# Altium footprint library Caps.PcbLib: 75 footprints (part 4 of 5)
Each footprint in its own frame and in the unit in brackets; x right, y up, seen from the top. Pads: shape width x height; smd on the part's side, far side on the other; paste and mask are expansions set on the pad; w line width, h text height; cw(c..) or ccw(c..) is an arc to the next point about the centre after c.
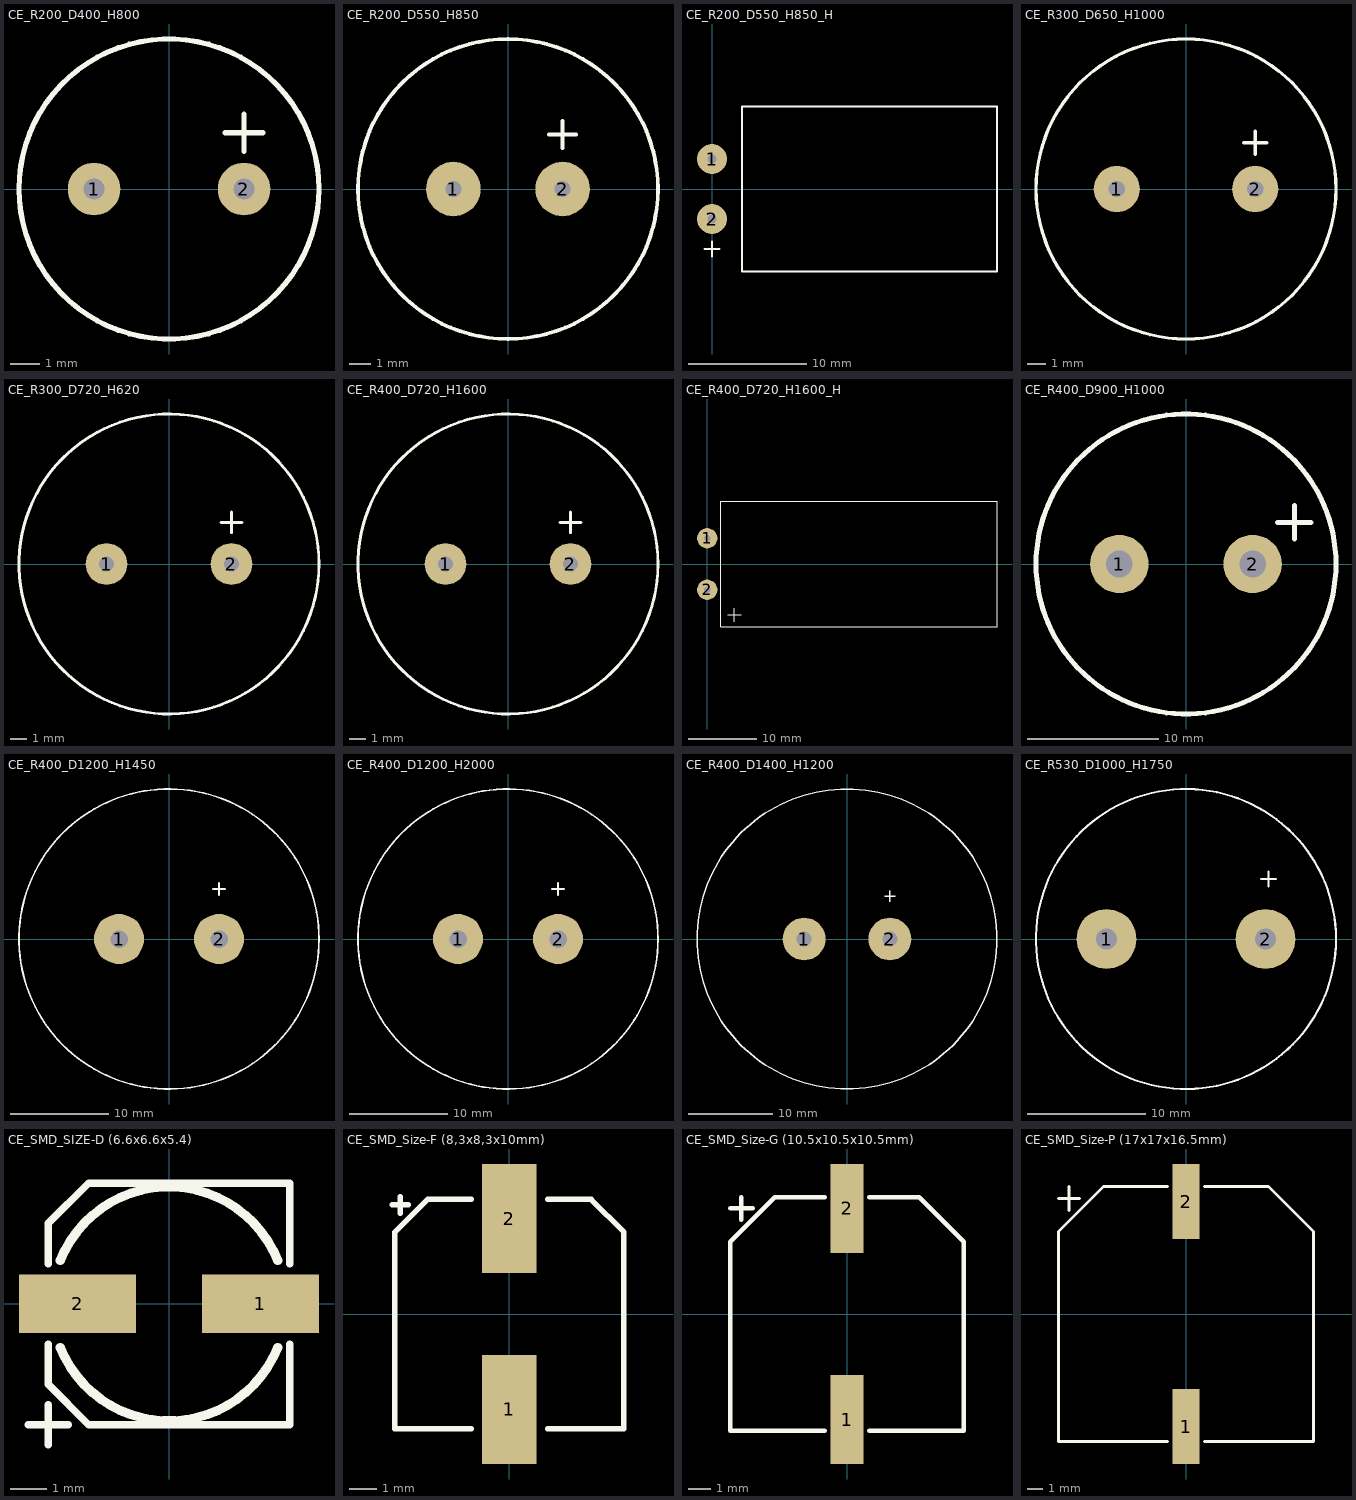
[diagram p3: the footprints below, top view; thin cyan lines are the x and y axes]

## CE_R200_D400_H800 [mil] "Raster=200mils, Dia=400mils_H=800mils"
height 850
pads (2):
  round 70 hole 28: 1(-100,0) 2(100,0)
Top Overlay:
  circle w7: c0,0 r200
  lines w7: 75,75 125,75 ; 100,50 100,100
3D body "CE_R200_D400_H800.STEP": height 800, standoff -114.17, extent -200,-200 200,198.98

## CE_R200_D550_H850 [mil] "Raster=200; Diameter=550; Hight=850"
height 850
pads (2):
  round 100 hole 30: 1(-100,0) 2(100,0)
Top Overlay:
  circle w7: c0,0 r275
  lines w7: 75,100 125,100 ; 100,75 100,125
3D body "CE_R200_D550_H850.STEP": height 846.46, standoff -118.11, extent -275.58,-275.55 275.6,275.56

## CE_R200_D550_H850_H [mil] "Horizontal"
height 550
pads (2):
  round 100 hole 30: 1(0,100) 2(0,-100)
Top Overlay:
  lines w7: -25,-200 25,-200 ; 0,-225 0,-175 ; 100,-275 100,275 950,275 950,-275 100,-275
3D body "CE_R200_D550_H850.STEP": height 550.56, standoff -0.56, extent -18.11,-275.58 946.46,275.6

## CE_R300_D650_H1000 [mil] "Raster=300mils, Dia=650mils, Hight=1000"
height 1000
pads (2):
  round 100 hole 35: 1(-150,0) 2(150,0)
Top Overlay:
  circle w7: c0,0 r325
  lines w7: 125,100 175,100 ; 150,75 150,125
3D body "CE_R300_D650_H1000.STEP": height 1028, standoff -109.8, extent -325,-325 323.94,323.06

## CE_R300_D720_H620 [mil] "Raster=300mils, Dia=720mils, Hight=620mils"
height 650
pads (2):
  round 100 hole 35: 1(-150,0) 2(150,0)
Top Overlay:
  circle w7: c0,0 r360
  lines w7: 125,100 175,100 ; 150,75 150,125
3D body "CE_R300_D720_H620.STEP": height 620, standoff -88.66, extent -354.33,-353.6 354.33,353.6

## CE_R400_D720_H1600 [mil] "Raster=400mils, Dia=720mils, Hight=1600mils"
height 1650
pads (2):
  round 100 hole 35: 1(-150,0) 2(150,0)
Top Overlay:
  circle w7: c0,0 r360
  lines w7: 125,100 175,100 ; 150,75 150,125
3D body "CE_R300_D720_H1600.STEP": height 1628, standoff -109.8, extent -359.84,-359.84 359.85,359.84

## CE_R400_D720_H1600_H [mm]
height 720
pads (2):
  round 3 hole 1: 1(0,3.81) 2(0,-3.81)
Top Overlay:
  lines w0.178: 3,-7.5 5,-7.5 ; 4,-8.5 4,-6.5 ; 2,-9.25 2,9.25 42.75,9.25 42.75,-9.25 2,-9.25
3D body "CE_R300_D720_H1600_Horizontal.STEP": height 18.28, standoff -2.86, extent -0.4,-9.14 42.64,9.14

## CE_R400_D900_H1000 [mil] "Vishay  BC Components"
height 1100
pads (2):
  round 175 hole 80 unplated: 1(-200,0) 2(200,0)
Top Overlay:
  circle w15: c0,0 r450
  lines w15: 275,125 375,125 ; 325,75 325,175
3D body "CE_R400_D900_H1000.STEP": height 1023.62, standoff -137.8, extent -440.94,-440.94 440.95,440.95

## CE_R400_D1200_H1450 [mil] "Raster=400mils, Dia=1200mils, H1450mils"
height 1500
pads (2):
  round 200 hole 70: 1(-200,0) 2(200,0)
Top Overlay:
  circle w7: c0,0 r600
  lines w7: 175,200 225,200 ; 200,175 200,225
3D body "CE_R400_D1200_H1450.STEP": height 1450, standoff -271.13, extent -600,-600 600,599.74

## CE_R400_D1200_H2000 [mil] "Raster=400mils, Dia=1200, Hight=2000"
height 2000
pads (2):
  round 200 hole 70: 1(-200,0) 2(200,0)
Top Overlay:
  circle w7: c0,0 r600
  lines w7: 175,200 225,200 ; 200,175 200,225
3D body "CE_R400_D1200_H2000.STEP": height 2000, standoff -271.13, extent -600,-599.95 600,600

## CE_R400_D1400_H1200 [mil] "Raster=400, Dia=1400, Hight=1200"
height 1200
pads (2):
  round 200 hole 70: 1(-200,0) 2(200,0)
Top Overlay:
  circle w7: c0,0 r700
  lines w7: 175,200 225,200 ; 200,175 200,225
3D body "CE_R400_D1400_H1200.STEP": height 1228.25, standoff -259.12, extent -688.97,-680.78 683.47,693.35

## CE_R530_D1000_H1750 [mil] "Raster=530mils, Dia=1000mils, Hight=1750mils"
height 1750
pads (2):
  round 200 hole 70: 1(-265,0) 2(265,0)
Top Overlay:
  circle w7: c0,0 r500
  lines w7: 250,200 300,200 ; 275,175 275,225
3D body "CE_R530_D1000_H1750.STEP": height 1661.42, standoff -98.43, extent -500,-500 500,500

## CE_SMD_SIZE-D (6.6x6.6x5.4) [mm] "Alu SMD Cap FI=6.3mm, H=5.4mm"
height 5.4
pads (2):
  rect 3.2x1.6 smd mask+0.08: 1(2.5,0) 2(-2.5,0)
Top Overlay:
  lines w0.203: -3.85,-3.3 -2.75,-3.3 ; -3.3,-3.85 -3.3,-2.75 ; -3.3,-1.1 -3.3,-2.2 -2.2,-3.3 3.3,-3.3 3.3,-1.1 ; -3.3,1.1 -3.3,2.2 -2.2,3.3 3.3,3.3 3.3,1.1
  lines w0.254: -2.971,-1.188 ccw(c0,0) 2.971,-1.188 ; -2.971,1.188 cw(c0,0) 2.971,1.188
3D body "SMD_ALU_SIZE-D.STEP": height 5.4, standoff 0, extent -3.6,-3.3 3.6,3.3

## CE_SMD_Size-F (8,3x8,3x10mm) [mm] "Aluminum Electrolytic Capacitor - Size F"
height 10
pads (2):
  rect 2x4 smd: 1(0,-3.5) 2(0,3.5)
Top Overlay:
  lines w0.203: -4.3,4 -3.7,4 ; -4,3.7 -4,4.3 ; -1.4,-4.2 -4.2,-4.2 -4.2,3 -3,4.2 -1.4,4.2 ; 1.4,-4.2 4.2,-4.2 4.2,3 3,4.2 1.4,4.2
3D body "SIZE_F.SLDPRT": height 10.3, standoff 0, extent -4.15,-4.65 4.15,4.65

## CE_SMD_Size-G (10.5x10.5x10.5mm) [mm] "AFK227M50 Cornell Dubiler"
height 10.5
pads (2):
  rect 1.5x4 smd: 1(0,-4.75) 2(0,4.75)
Top Overlay:
  lines w0.203: -5.25,4.75 -4.25,4.75 ; -4.75,4.25 -4.75,5.25 ; -1,-5.25 -5.25,-5.25 -5.25,3.25 -3.25,5.25 -1,5.25 ; 1,-5.25 5.25,-5.25 5.25,3.25 3.25,5.25 1,5.25
3D body "Panasonic_FK_G.STEP": height 11, standoff 0, extent -5.15,-5.95 5.15,5.95

## CE_SMD_Size-P (17x17x16.5mm) [mm] "AFK108M50P44T-F (Cornell Dubiler)"
height 16.5
pads (2):
  rect 1.8x5 smd: 1(0,-7.5) 2(0,7.5)
Top Overlay:
  lines w0.203: -8.5,7.7 -7.1,7.7 ; -7.8,6.9 -7.8,8.5 ; -1.25,-8.5 -8.5,-8.5 -8.5,5.5 -5.5,8.5 -1.25,8.5 ; 1.25,-8.5 8.5,-8.5 8.5,5.5 5.5,8.5 1.25,8.5
3D body "Panasonic_FK_J16.STEP": height 17.7, standoff 0, extent -8.5,-9.5 8.5,9.5